# Altium schematic symbol library Altium_Lib.SchLib: 403 symbols (part 2 of 4) (continued)
## LED_BLUE__LTST-C171TBKT (continued)
LED BLUE CLEAR 0805 SMD; Manufacturer: Lite-On Inc.; Lens Color: Colorless; Millicandela Rating: 104mcd; Lens Style/Size: Rectangle with Flat Top, 1.40mm x 1.25mm; Voltage - Forward (Vf) (Typ): 3.3V; Current - Test: 20mA; Viewing Angle: 130°; Wavelength - Dominant: 470nm; Wavelength - Peak: 468nm; Manufacturer Part Number: LTST-C171TBKT; Category: Optoelectronics; Supplier: Digi-Key; RoHS: RoHS Compliant; Packaging: Tape & Reel (TR); Part Status: Active; Color: Blue; Lens Transparency: Clear; Mounting Type: Surface Mount; Features: -; Package / Case: 0805 (2012 Metric); Size / Dimension: 2.00mm L x 1.25mm W; Height (Max): 0.80mm; ComponentLink1URL: http://optoelectronics.liteon.com/upload/download/DS22-2000-233/LTST-C171TBKT(0630).pdf; ComponentLink1Description: http://optoelectronics.liteon.com/upload/download/DS22-2000-233/LTST-C171TBKT(0630).pdf; Pricing: 3000=0.0728, 6000=0.06552, 15000=0.05824, 30000=0.0546, 75000=0.04914, 150000=0.04732 (USD); Supplier Part Number: 160-1645-2-ND
footprint Diode_0805_Blue
pins: 1 A, 2 K

## LED_GREEN__LG L29K-F2J1-24-Z
designator D?, comment LG L29K-F2J1-24-Z  Color: Green
LED GREEN DIFFUSED 0603 SMD; Manufacturer: OSRAM Opto Semiconductors Inc.; Lens Style/Size: Rectangle with Flat Top, 1.30mm x 0.80mm; Lens Color: White; Wavelength - Peak: 572nm; Viewing Angle: 160°; Voltage - Forward (Vf) (Typ): 1.7V; Wavelength - Dominant: 570nm; Current - Test: 2mA; Millicandela Rating: 3.5mcd; Category: Optoelectronics; RoHS: RoHS Compliant; Supplier: Digi-Key; Packaging: Cut Tape (CT); Features: -; Manufacturer Part Number: LG L29K-F2J1-24-Z; Part Status: Active; Mounting Type: Surface Mount; Package / Case: 0603 (1608 Metric); Lens Transparency: Diffused; Supplier Device Package: 0603; Size / Dimension: 1.70mm L x 0.80mm W; Height (Max): 0.65mm; ComponentLink1URL: https://dammedia.osram.info/media/resource/hires/osram-dam-2493945/LG%20L29K.pdf; ComponentLink1Description: https://dammedia.osram.info/media/resource/hires/osram-dam-2493945/LG%20L29K.pdf; Pricing: 1=0.45, 10=0.319, 25=0.2768, 100=0.213, 250=0.17304, 500=0.12778, 1000=0.10648, 2500=0.09583 (USD); Supplier Part Number: 475-3118-1-ND
footprint DIODE_0603_Green (Chip Resistor; Body 1.6 x 0.8 mm (LxW typ))
pins: 1 A, 2 K

## LED_GREEN__LG R971-KN-1
designator D?, comment LG R971-KN-1
LED GREEN DIFFUSED 0805 SMD; Manufacturer: OSRAM Opto Semiconductors Inc.; ID: 1963782; Lens Color: White; Millicandela Rating: 26.05mcd; Lens Style/Size: Rectangle with Flat Top, 1.30mm x 1.25mm; Voltage - Forward (Vf) (Typ): 2.2V; Current - Test: 20mA; Viewing Angle: 160°; Wavelength - Dominant: 570nm; Wavelength - Peak: 572nm; Package Quantity: 1; RoHS: RoHS Compliant; Manufacturer Part Number: LG R971-KN-1; Supplier: Digi-Key; Category: Optoelectronics; Packaging: Tape & Reel (TR); Part Status: Active; Color: Green; Lens Transparency: Diffused; Mounting Type: Surface Mount; Features: -; Package / Case: 0805 (2012 Metric); Supplier Device Package: 0805; Size / Dimension: 2.00mm L x 1.25mm W; Height (Max): 0.90mm; ComponentLink1URL: http://www.osram-os.com/Graphics/XPic9/00078860_0.pdf; ComponentLink1Description: http://www.osram-os.com/Graphics/XPic9/00078860_0.pdf; Pricing: 4000=0.03966, 8000=0.03449, 12000=0.03104, 28000=0.02874 (USD); Supplier Part Number: 475-1410-2-ND
footprint Diode_0805_Green
pins: 1 A, 2 K

## LED_GREEN__LN38GPX
designator D?, comment LN38GPX  Color: Green
LED GREEN 3MM ROUND T/H; Manufacturer: Panasonic Electronic Components; Configuration: Standard; Millicandela Rating: 6mcd; Lens Style: Round with Domed Top; Lens Size: 3mm, T-1; Voltage - Forward (Vf) (Typ): 2.2V; Current - Test: 20mA; Wavelength - Peak: 565nm; Supplier 1: Digi-Key; Manufacturer Part Number: LN38GPX; RoHS: RoHS Compliant; Category: Optoelectronics; Stock 1: 0; Pricing 1: 1400=0 (USD); Packaging: Bulk; Part Status: Obsolete; Lens Color: -; Lens Transparency: -; Viewing Angle: -; Mounting Type: Through Hole; Wavelength - Dominant: -; Features: -; Package / Case: Radial; Supplier Device Package: Round Type; Size / Dimension: -; Height (Max): 5.70mm; Base Part Number: LN*8; ComponentLink1URL: https://media.digikey.com/pdf/Data%20Sheets/Panasonic%20LEDs%20PDFs/LN38GPX_Rev_Mar_2012.pdf; ComponentLink1Description: https://media.digikey.com/pdf/Data%20Sheets/Panasonic%20LEDs%20PDFs/LN38GPX_Rev_Mar_2012.pdf; Supplier Part Number 1: P564-ND
footprint Led-3mm-Green-h7
pins: 1 A, 2 K

## LED_GREEN__SML-M13MTT86
designator D?, comment SML-M13MTT86
LED Uni-Color Yellowish Green 2-Pin Chip 0805(2012Metric) T/R; Manufacturer: Rohm; Color: Green,Yellow; Lens Color: Colorless; Lens Style: Colorless,Rectangular; Dominant Wavelength: 572nm; Number of LEDs: 1; Forward Current: 20mA; Forward Voltage: 2.2V; Luminous Intensity: 45mcd; Lens Transparency: Clear; Supplier 1: Digi-Key; Manufacturer Part Number: SML-M13MTT86; RoHS: Yes; Category: LEDs; Mount: Surface Mount; Case/Package: 0805; Number of Pins: 2; Case Code (Metric): 2012; Case Code (Imperial): 0805; Min Operating Temperature: -40°C; Max Operating Temperature: 85°C; Package Quantity: 1; Illumination Color: Green; Packaging: Tape and Reel; Test Current: 20mA; Series: SML-M1; Length: 2mm; Width: 1.25mm; Height: 0.9mm; Radiation Hardening: No; Lead Free: Lead Free; RoHS Compliant: Yes; Supplier Part Number 1: 846-1028-1-ND; ComponentLink1Description: Datasheet; ComponentLink1URL: https://www.mouser.com.tr/datasheet/2/348/sml-m13x_mn2x-e-1874485.pdf
footprint Diode_0805_Green
pins: 1 A, 2 K

## LED_RED__LN28RPX
designator D?, comment LN28RPX  Lens Color: Red
LED RED DIFF 3MM ROUND T/H; Manufacturer: Panasonic Electronic Components; Lens Transparency: Diffused; Millicandela Rating: 2.8mcd; Lens Style/Size: Round with Domed Top, 3mm (T-1), 3.00mm; Voltage - Forward (Vf) (Typ): 2.2V; Current - Test: 15mA; Wavelength - Peak: 700nm; Manufacturer Part Number: LN28RPX; Category: Optoelectronics; Supplier: Digi-Key; RoHS: RoHS Compliant; Packaging: Bulk; Part Status: Not For New Designs; Color: Red; Viewing Angle: -; Mounting Type: Through Hole; Wavelength - Dominant: -; Features: -; Package / Case: Radial; Supplier Device Package: 3mm Round; Size / Dimension: -; Height (Max): 5.70mm; ComponentLink1URL: http://industrial.panasonic.com/www-cgi/jvcr13pz.cgi?E+SC+4+ATA7001+LN28RPX+8+WW; ComponentLink1Description: http://industrial.panasonic.com/www-cgi/jvcr13pz.cgi?E+SC+4+ATA7001+LN28RPX+8+WW; Pricing: 1=0.45, 10=0.326, 25=0.2664, 100=0.213, 250=0.17972, 500=0.15308, 1000=0.11981, 2500=0.10982, 5000=0.09984 (USD); Supplier Part Number: P563-ND
footprint Led-3mm-Red-h7
pins: 1 A, 2 K

## LED_RED__LS Q976-NR-1
designator D?, comment LS Q976-NR-1  Color: Red
LED RED DIFFUSED 0603 SMD; Manufacturer: OSRAM Opto Semiconductors Inc.; Lens Color: White; Lens Style/Size: Rectangle with Flat Top, 1.00mm x 0.80mm; Millicandela Rating: 104mcd; Current - Test: 20mA; Viewing Angle: 160°; Wavelength - Dominant: 633nm; Wavelength - Peak: 645nm; Voltage - Forward (Vf) (Typ): 2V; Size / Dimension: 1.60mm L x 0.80mm W; Height (Max): 0.80mm; Supplier: Digi-Key; Manufacturer Part Number: LS Q976-NR-1; Category: Optoelectronics; RoHS: RoHS Compliant; Part Status: Active; Packaging: Tape & Reel (TR); Lens Transparency: Diffused; Features: -; Package / Case: 0603 (1608 Metric); Supplier Device Package: 0603; Mounting Type: Surface Mount; ComponentLink1URL: https://dammedia.osram.info/media/resource/hires/osram-dam-2493499/LS%20Q976.pdf; ComponentLink1Description: https://dammedia.osram.info/media/resource/hires/osram-dam-2493499/LS%20Q976.pdf; Pricing: 4000=0.05566, 8000=0.0484, 12000=0.04356, 28000=0.03872, 100000=0.03267 (USD); Supplier Part Number: 475-2512-2-ND
footprint DIODE_0603_Red (Chip Resistor; Body 1.6 x 0.8 mm (LxW typ))
pins: 1 A, 2 K

## LED_RED__LS R976-NR-1
designator D?, comment LS R976-NR-1
LED RED DIFFUSED 0805 SMD; Manufacturer: OSRAM Opto Semiconductors Inc.; Wavelength - Dominant: 633nm; Viewing Angle: 160°; Wavelength - Peak: 645nm; Lens Color: White; Current - Test: 20mA; Lens Style/Size: Rectangle with Flat Top, 1.30mm x 1.25mm; Voltage - Forward (Vf) (Typ): 2V; Millicandela Rating: 104mcd; Package / Case: 0805 (2012 Metric); Packaging: Tape & Reel (TR); Features: -; Category: Optoelectronics; Supplier: Digi-Key; RoHS: RoHS Compliant; Manufacturer Part Number: LS R976-NR-1; Part Status: Active; Mounting Type: Surface Mount; Supplier Device Package: 0805; Lens Transparency: Diffused; Color: Red; Size / Dimension: 2.00mm L x 1.25mm W; Height (Max): 0.90mm; ComponentLink1URL: http://www.osram-os.com/Graphics/XPic8/00078896_0.pdf; ComponentLink1Description: http://www.osram-os.com/Graphics/XPic8/00078896_0.pdf; Pricing: 4000=0.04175, 8000=0.0363, 12000=0.03267, 28000=0.03025 (USD); Supplier Part Number: 475-1278-2-ND
footprint Diode_0805_Red
pins: 1 A, 2 K

## LED_WHITE__2T05x5NW20000001
designator D?
ET-5630X-AF1W series White LED; Manufacturer: EDISON OPTO CORPORATION; Manufacturer Part Number: 2T05x5NW20000001
footprint PLCC 5630
pins: 0 Termal, 1 A, 2 K

## LED_WHITE__CLA2A-WKW-CXBZ0153
designator D?, comment Illumination Color: Cool White  (hidden comment: CLA2A-WKW-CXbZ0153)
LED COOL WHITE DIFF 4PLCC SMD; Manufacturer: Cree, Inc.; Power Rating: 2 x 100 mW; Lens Color: Tinted; Lens Shape: Round Flat; Luminous Intensity: 3800 mcd; Viewing Angle: 120 deg; If - Forward Current: 20 mA; Vf - Forward Voltage: 3.2 V; Vr - Reverse Voltage: 5 V; Wavelength/Color Temperature: 5500 K; Supplier 1: Mouser; Manufacturer Part Number: CLA2A-WKW-CXbZ0153; RoHS: RoHS Compliant; Category: Standard LEDs - SMD; Stock 1: 3506; Pricing 1: 1=0.290, 10=0.270, 100=0.247, 1000=0.223, 2000=0.223, 10000=0.217, 50000=0.200 (USD); Height: 1.9 mm; Length: 3.2 mm; Package / Case: PLCC-4; Packaging: Cut Tape; Product: White LEDs; Width: 2.8 mm; Brand: Cree, Inc.; Mounting Style: SMD/SMT; Peak Wavelength: -; Color Rendering Index - CRI: -; Lens Dimensions: -; Luminous Flux/Radiant Flux: -; Maximum Operating Temperature: + 100 C; Minimum Operating Temperature: - 40 C; Moisture Sensitive: Yes; Operating Supply Voltage: -; Product Type: LED - Standard; Standard Pack Qty: 2000; Subcategory: LEDs; RoHS - Mouser: Y; Minimum Order Quantity: 1; Reeling: True; ComponentLink1URL: https://www.mouser.com/datasheet/2/90/CLA2AWKW(931)-1140814.pdf; ComponentLink1Description: https://www.mouser.com/datasheet/2/90/CLA2AWKW(931)-1140814.pdf; Supplier Part Number 1: 941-CLA2AWKWCXBZ0153
footprint LED_PLCC4_3.2x2.8_WHITE
pins: 1 A, 2 A, 3 K, 4 K

## LIS2DH12TR
designator U?
ACCEL 2-16G I2C/SPI 12LGA; Manufacturer: STMicroelectronics; Axis: X, Y, Z; Acceleration Range: ±2g, 4g, 8g, 16g; Output Type: I²C, SPI; Sensitivity (LSB/g): 1000 (±2g) ~ 83 (±16g); Bandwidth: 0.5Hz ~ 672Hz; Voltage - Supply: 1.71 V ~ 3.6 V; Operating Temperature: -40°C ~ 85°C (TA); Package / Case: 12-VFLGA; Part Status: Active; Type: Digital; Features: Adjustable Bandwidth, Selectable Scale, Sleep Mode, Temperature Sensor; Category: Sensors, Transducers; Packaging: Cut Tape (CT); Manufacturer Part Number: LIS2DH12TR; Sensitivity (mV/g): -; Supplier Device Package: 12-LGA (2x2); RoHS: RoHS Compliant; Mounting Type: Surface Mount; Supplier: Digi-Key; ComponentLink1URL: http://www.st.com/content/ccc/resource/technical/document/datasheet/12/c0/5c/36/b9/58/46/f2/DM00091513.pdf/files/DM00091513.pdf/jcr:content/translations/en.DM00091513.pdf; ComponentLink1Description: http://www.st.com/content/ccc/resource/technical/document/datasheet/12/c0/5c/36/b9/58/46/f2/DM00091513.pdf/files/DM00091513.pdf/jcr:content/translations/en.DM00091513.pdf; Pricing: 1=1.53, 10=1.367, 100=1.0661, 500=0.88066, 1000=0.69525 (USD); Supplier Part Number: 497-14851-1-ND
footprint LGA-12
pins: 1 SCL/SPC, 2 CS, 3 SDO/SA0, 4 SDA/SDI/SDO, 5 RES, 6 GND, 7 GND, 8 GND, 9 VDD, 10 VDD_IO, 11 INT2, 12 INT1

## LIS3DH
designator U?
MEMS Motion Sensor LGA; Manufacturer: STMicroelectronics; Interface: I2C,SPI; Axis: X, Y, Z; Bandwidth: 5kHz; Output Type: Digital; Operating Supply Voltage: 2.5V; Sensor Type: 3 Axis; Min Supply Voltage: 1.71V; Max Supply Voltage: 3.6V; Resolution: 16b; Operating Supply Current: 11uA; Supplier 1: Avnet; Manufacturer Part Number: LIS3DH; Stock 1: 0; Case/Package: LGA; Number of Pins: 16; Min Operating Temperature: -40°C; Max Operating Temperature: 85°C; Package Quantity: 490; Packaging: Tray; Series: LIS3DH; Max Supply Voltage (DC): 3.6V; Min Supply Voltage (DC): 1.71V; Length: 3mm; Width: 3mm; Height: 1mm; Depth: 3mm; Radiation Hardening: No; REACH SVHC: No SVHC; Lead Free: Lead Free; RoHS Compliant: Yes; ComponentLink1URL: http://www.farnell.com/datasheets/1834384.pdf?src-supplier=Element14; ComponentLink1Description: http://www.farnell.com/datasheets/1834384.pdf?src-supplier=Element14; ComponentLink2URL: http://www.st.com/content/ccc/resource/technical/document/datasheet/3c/ae/50/85/d6/b1/46/fe/CD00274221.pdf/files/CD00274221.pdf/jcr:content/translations/en.CD00274221.pdf?src-supplier=Digi-Key; ComponentLink2Description: http://www.st.com/content/ccc/resource/technical/document/datasheet/3c/ae/50/85/d6/b1/46/fe/CD00274221.pdf/files/CD00274221.pdf/jcr:content/translations/en.CD00274221.pdf?src-supplier=Digi-Key; ComponentLink3URL: http://www.mouser.com/ds/2/389/lis3dh-955037.pdf?src-supplier=Mouser; ComponentLink3Description: http://www.mouser.com/ds/2/389/lis3dh-955037.pdf?src-supplier=Mouser; ComponentLink4URL: http://www.st.com/web/en/resource/technical/document/datasheet/CD00274221.pdf?src-supplier=Avnet+Europe; ComponentLink4Description: http://www.st.com/web/en/resource/technical/document/datasheet/CD00274221.pdf?src-supplier=Avnet+Europe; ComponentLink5URL: http://datasheet.iiic.cc/stmicroelectronics/LIS3DH.pdf?src-supplier=IIIC; ComponentLink5Description: http://datasheet.iiic.cc/stmicroelectronics/LIS3DH.pdf?src-supplier=IIIC; Supplier Part Number 1: LIS3DH
footprint VFLGA-16
pins: 1 VDD_IO, 2 NC, 3 NC, 4 SCL/SPC, 5 GND, 6 SDA/SDI/SDO, 7 SA0/SDO, 8 CS, 9 INT2, 10 RES, 11 INT1, 12 GND, 13 ADC3, 14 VDD, 15 ADC2, 16 ADC1

## LM35DZ/NOPB
designator T?
SENSOR TEMP ANLG VOLT TO-92-3; Manufacturer: Texas Instruments; Voltage - Supply: 4 V ~ 30 V; Resolution: 10mV/°C; Output Type: Analog Voltage; Test Condition: 25°C; Accuracy - Highest (Lowest): ±1.5°C; Sensing Temperature - Local: 0°C ~ 100°C; Sensor Type: Analog, Local; Category: Sensors, Transducers; Packaging: Bulk; Part Status: Active; Operating Temperature: 0°C ~ 100°C; Supplier: Digi-Key; Manufacturer Part Number: LM35DZ/NOPB; Mounting Type: Through Hole; Features: -; Package / Case: TO-226-3, TO-92-3 (TO-226AA); Sensing Temperature - Remote: -; Supplier Device Package: TO-92-3; RoHS: RoHS Compliant; ComponentLink1URL: http://www.ti.com/lit/ds/symlink/lm35.pdf; ComponentLink1Description: http://www.ti.com/lit/ds/symlink/lm35.pdf; Pricing: 1=1.86, 10=1.459, 25=1.2572, 100=0.9878, 250=0.898, 500=0.83066, 1000=0.74085 (USD); Stock: 11050; Supplier Part Number: LM35DZ/NOPB-ND
footprint TO-92
pins: 1 +VS (power), 2 Vout (power), 3 GND (power)

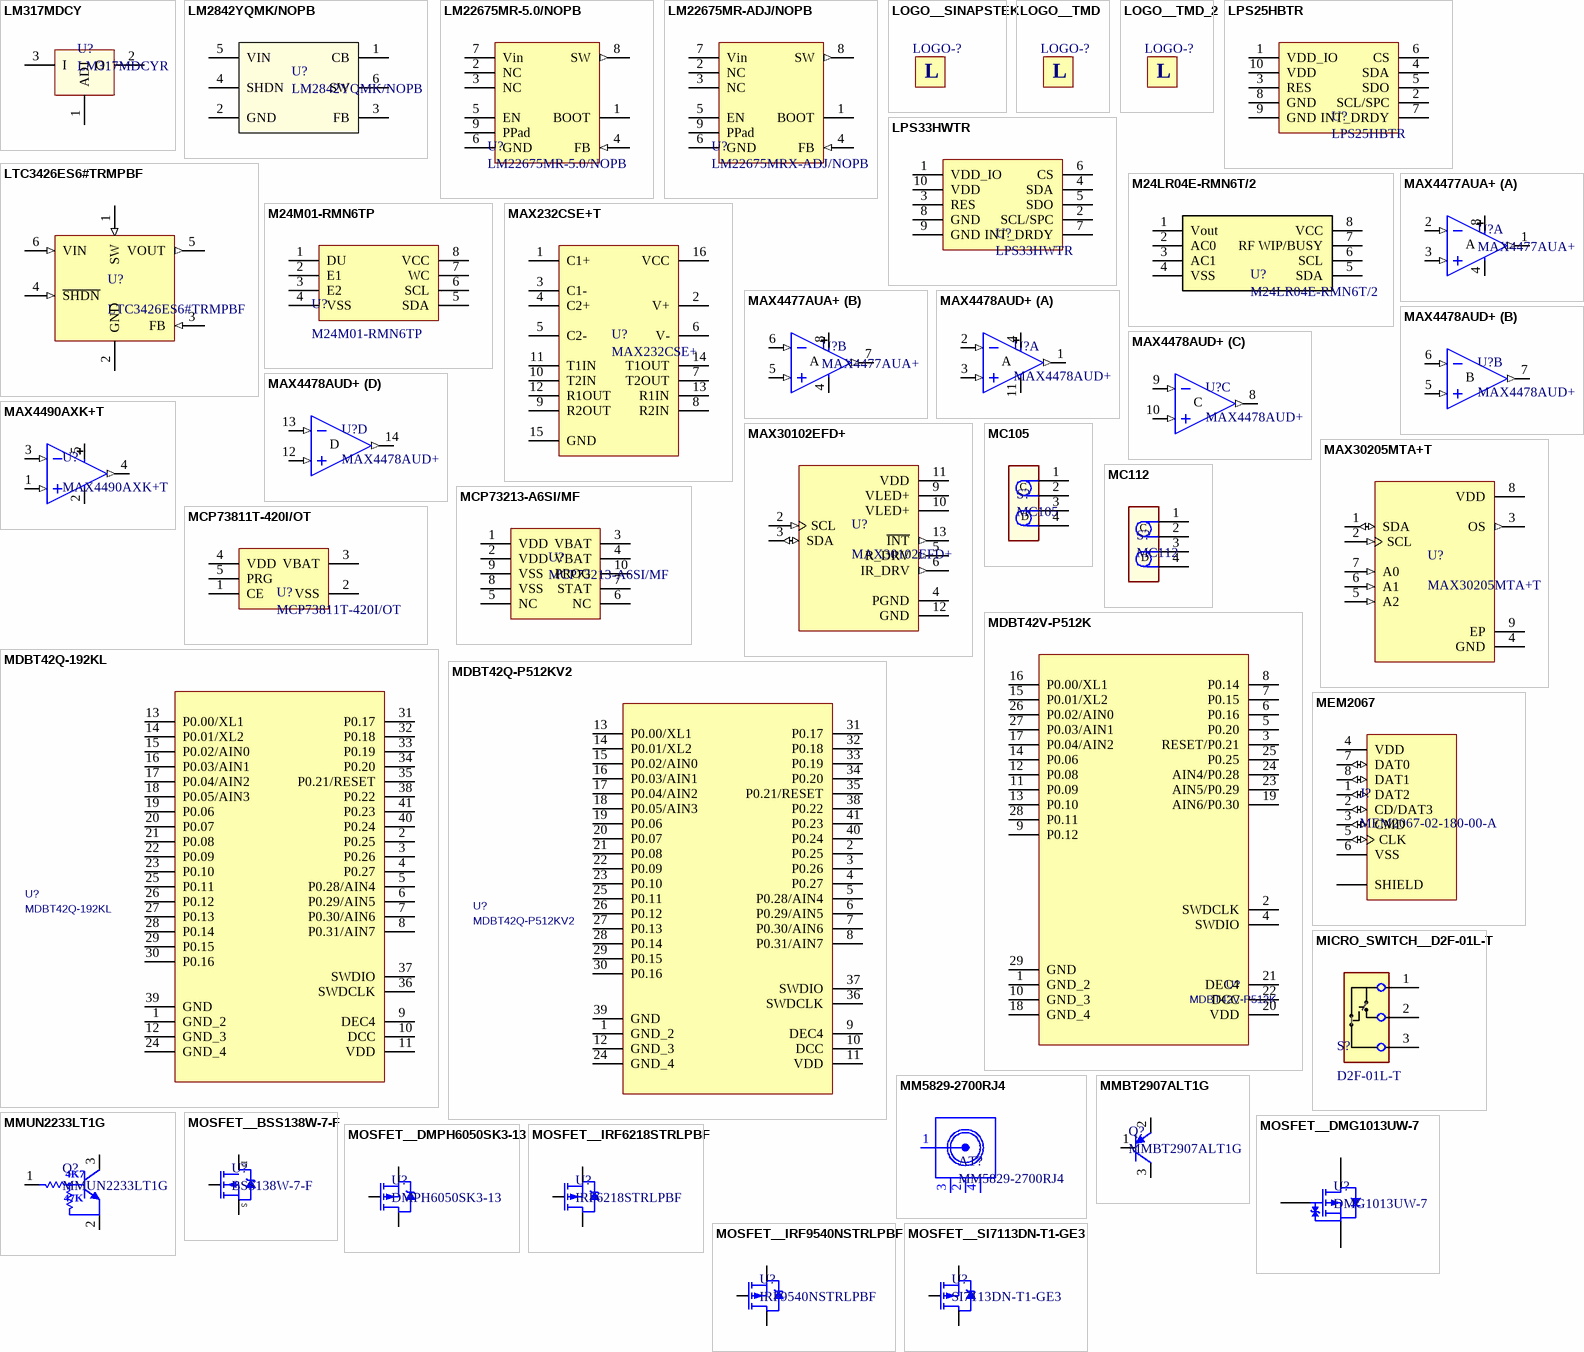
[diagram p6: symbols LM317MDCY to MOSFET__SI7113DN-T1-GE3]

## LM317MDCY
designator U?, comment LM317MDCYR
IC REG LINEAR ADJ 0.5A SOT223; Manufacturer: Texas Instruments; Regulator Topology: Positive Adjustable; Current - Output: 500mA; Voltage - Output: 1.25 V ~ 37 V; Voltage - Input: 4.2 V ~ 40 V; Packaging: Tape & Reel (TR); Manufacturer Part Number: LM317MDCYR; Supplier: Digi-Key; Part Status: Active; RoHS: RoHS Compliant; Supplier Device Package: SOT-223-4; Package / Case: TO-261-4, TO-261AA; Voltage - Dropout (Typical): -; Mounting Type: Surface Mount; Current - Limit (Min): -; Operating Temperature: 0°C ~ 125°C; Category: Integrated Circuits (ICs); ComponentLink1URL: http://www.ti.com/lit/ds/symlink/lm317m.pdf; ComponentLink1Description: http://www.ti.com/lit/ds/symlink/lm317m.pdf; Pricing: 2500=0.319, 5000=0.297, 12500=0.286 (USD); Supplier Part Number: 296-12631-2-ND
footprint SOT-223-4 (SOT223/SC73, 4-Leads, Body 6.5x3.5mm, Pitch 2.3mm, Lead Span 7mm, IPC High Density)
pins: 1 ADJ (power), 2 O (power), 3 I (power)

## LM2842YQMK/NOPB
designator U?
IC REG BUCK ADJ 0.6A TSOT23-6; Manufacturer: Texas Instruments; Voltage - Output (Max): 34V; Voltage - Output (Min/Fixed): 0.765V; Voltage - Input (Max): 42V; Voltage - Input (Min): 4.5V; Synchronous Rectifier: No; Number of Outputs: 1; Frequency - Switching: 1.25MHz; Current - Output: 600mA; Output Type: Adjustable; Output Configuration: Positive; Function: Step-Down; Base Part Number: LM2842; Package / Case: SOT-23-6 Thin, TSOT-23-6; Supplier Device Package: TSOT-23-6; Mounting Type: Surface Mount; Operating Temperature: -40°C ~ 125°C (TJ); Packaging: Tape & Reel (TR); Topology: Buck; Part Status: Active; RoHS: RoHS Compliant; Supplier: Digi-Key; Category: Integrated Circuits (ICs); Manufacturer Part Number: LM2842YQMK/NOPB; ComponentLink1URL: http://www.ti.com/lit/ds/symlink/lm2841.pdf; ComponentLink1Description: http://www.ti.com/lit/ds/symlink/lm2841.pdf; Pricing: 1000=1.7864, 2000=1.69708, 5000=1.63328 (USD); Supplier Part Number: 296-35999-2-ND
footprint SOT23-6 (SOT-23/SC-74A; 5 Leads; Body 3 x 3 mm, inc. leads (LxW max))
pins: 1 CB, 2 GND, 3 FB, 4 SHDN, 5 VIN, 6 SW

## LM22675MR-5.0/NOPB
designator U?
IC REG BUCK 5V 1A 8SOPWRPAD; Manufacturer: Texas Instruments; Frequency - Switching: 500kHz; Function: Step-Down; Number of Outputs: 1; Output Configuration: Positive; Output Type: Fixed; Synchronous Rectifier: No; Voltage - Input (Max): 42V; Voltage - Input (Min): 4.5V; Category: Integrated Circuits (ICs); Current - Output: 1A; Manufacturer Part Number: LM22675MR-5.0/NOPB; Mounting Type: Surface Mount; Operating Temperature: -40°C ~ 125°C (TJ); Package / Case: 8-PowerSOIC (0.154", 3.90mm Width); Packaging: Tube; Part Status: Active; RoHS: RoHS Compliant; Supplier: Digi-Key; Supplier Device Package: 8-SO PowerPad; Topology: Buck; Voltage - Output (Max): -; Voltage - Output (Min/Fixed): 5V; ComponentLink1URL: http://www.ti.com/lit/ds/symlink/lm22675.pdf; ComponentLink1Description: http://www.ti.com/lit/ds/symlink/lm22675.pdf; Pricing: 1=4.44, 10=3.984, 100=3.2643, 500=2.77884, 1000=2.3436 (USD); Supplier Part Number: LM22675MR-5.0/NOPB-ND
footprint SOIC_8_Power (8-PowerSOIC (0.154", 3.90mm Width))
pins: 1 BOOT (power), 2 NC, 3 NC, 4 FB (in), 5 EN (power), 6 GND (power), 7 Vin (power), 8 SW (out), 9 PPad (power)

## LM22675MR-ADJ/NOPB
designator U?, comment LM22675MRX-ADJ/NOPB
IC REG BUCK ADJ 1A 8SOPWRPAD; Manufacturer: Texas Instruments; Voltage - Output (Max): 37V; Synchronous Rectifier: No; Frequency - Switching: 500kHz; Output Configuration: Positive; Voltage - Input (Max): 42V; Voltage - Input (Min): 4.5V; Number of Outputs: 1; Voltage - Output (Min/Fixed): 1.285V; Function: Step-Down; Output Type: Adjustable; Supplier Device Package: 8-SO PowerPad; Manufacturer Part Number: LM22675MRX-ADJ/NOPB; Package / Case: 8-PowerSOIC (0.154", 3.90mm Width); RoHS: RoHS Compliant; Mounting Type: Surface Mount; Current - Output: 1A; Part Status: Active; Operating Temperature: -40°C ~ 125°C (TJ); Base Part Number: LM22675; Supplier: Digi-Key; Packaging: Cut Tape (CT); Topology: Buck; Category: Integrated Circuits (ICs); ComponentLink1URL: http://www.ti.com/lit/ds/symlink/lm22675.pdf; ComponentLink1Description: http://www.ti.com/lit/ds/symlink/lm22675.pdf; Supplier 1: Digi-Key; Supplier Part Number: 296-37362-1-ND
footprint SOIC_8_Power (8-PowerSOIC (0.154", 3.90mm Width))
pins: 1 BOOT (power), 2 NC, 3 NC, 4 FB (in), 5 EN (power), 6 GND (power), 7 Vin (power), 8 SW (out), 9 PPad (power)

## LOGO__SINAPSTEK
designator LOGO-?, comment Logo  (value not drawn)  (no BOM)
Value: Logo
footprint Logo-Sinapstek
text: L

## LOGO__TMD
designator LOGO-?, comment Logo  (value not drawn)  (no BOM)
Value: Logo
footprint Logo-TMD
text: L

## LOGO__TMD_2
designator LOGO-?, comment Logo  (value not drawn)  (no BOM)
Value: Logo
footprint Logo-TMD2
text: L

## LPS25HBTR
designator U?
IC MEMS PRESSURE SENSOR 10HCLGA; Manufacturer: STMicroelectronics; Pressure Type: Absolute; Operating Pressure: 3.77 PSI ~ 18.27 PSI (26 kPa ~ 126 kPa); Output Type: I²C, SPI; Output: 24 b; Accuracy: ±0.003 PSI (±0.02 kPa); Voltage - Supply: 1.7 V ~ 3.6 V; Port Style: No Port; Maximum Pressure: 290.08 PSI (2000 kPa); Manufacturer Part Number: LPS25HBTR; Category: Sensors, Transducers; Supplier: Digi-Key; RoHS: RoHS Compliant; Part Status: Active; Port Size: -; Features: Temperature Compensated; Termination Style: Solder Pad; Operating Temperature: -30°C ~ 105°C; Package / Case: 10-VFLGA; Supplier Device Package: 10-LLGA (2.5x2.5); ComponentLink1URL: http://www.st.com/content/ccc/resource/technical/document/datasheet/9a/4c/aa/72/1f/45/4e/24/DM00141379.pdf/files/DM00141379.pdf/jcr:content/translations/en.DM00141379.pdf; ComponentLink1Description: http://www.st.com/content/ccc/resource/technical/document/datasheet/9a/4c/aa/72/1f/45/4e/24/DM00141379.pdf/files/DM00141379.pdf/jcr:content/translations/en.DM00141379.pdf; Supplier Part Number: 497-15070-2-ND
footprint HLGA-10L
pins: 1 VDD_IO, 2 SCL/SPC, 3 RES, 4 SDA, 5 SDO, 6 CS, 7 INT_DRDY, 8 GND, 9 GND, 10 VDD

## LPS33HWTR
designator U?
CONSUMER MEMS; Manufacturer: STMicroelectronics; Pressure Type: Absolute; Operating Pressure: 0.04 PSI ~ 0.18 PSI (0.26 kPa ~ 1.26 kPa); Output Type: I²C, SPI; Output: 24 b; Accuracy: ±0.015 PSI (±0.1 kPa); Voltage - Supply: 1.7 V ~ 3.6 V; Port Style: No Port; Maximum Pressure: 290.08 PSI (2000 kPa); Manufacturer Part Number: LPS33HWTR; Category: Sensors, Transducers; Supplier: Digi-Key; RoHS: Request Inventory Verification; Part Status: Active; Port Size: -; Features: Temperature Compensated; Termination Style: Surface Mount; Operating Temperature: -40°C ~ 85°C; Package / Case: LGA; Supplier Device Package: 10-CCLGA (3.3x3.3); ComponentLink1URL: http://www.st.com/content/ccc/resource/technical/document/datasheet/group3/9f/16/0d/6e/ea/20/4e/dc/DM00386016/files/DM00386016.pdf/jcr:content/translations/en.DM00386016.pdf; ComponentLink1Description: http://www.st.com/content/ccc/resource/technical/document/datasheet/group3/9f/16/0d/6e/ea/20/4e/dc/DM00386016/files/DM00386016.pdf/jcr:content/translations/en.DM00386016.pdf; Pricing: 2500=4.6813 (USD); Supplier Part Number: 497-17590-2-ND
footprint CCLGA-10L (CCLGA - 10L (3.3 x 3.3 x max 2.9 mm))
pins: 0 TPAD hidden to GND, 1 VDD_IO, 2 SCL/SPC, 3 RES, 4 SDA, 5 SDO, 6 CS, 7 INT_DRDY, 8 GND, 9 GND, 10 VDD

## LTC3426ES6#TRMPBF
designator U?
Conv DC-DC 1.6V to 4.3V Step Up Single-Out 2.25V to 5V 2.3A Automotive 6-Pin TSOT-23 T/R; Manufacturer: Analog Devices / Linear Technology; Output Voltage: 5.5V; Output Current: 2A; Switching Frequency: 1.5MHz; Number of Outputs: 1; Synchronous Rectifier: No; Topology: Boost; Output Type: Adjustable; Supplier 1: Digi-Key; Manufacturer Part Number: LTC3426ES6#TRMPBF; RoHS: Yes; Category: Voltage Regulators - Switching; Case/Package: SOT-23-6; Number of Pins: 6; Min Operating Temperature: -40°C; Max Operating Temperature: 85°C; Max Input Voltage: 4.3V; Package Quantity: 1; Min Input Voltage: 1.6V; Packaging: Tape and Reel; Min Output Voltage: 2.25V; Max Output Voltage: 5V; Series: -; REACH SVHC: No SVHC; Lead Free: Lead Free; RoHS Compliant: Yes; ComponentLink1URL: https://datasheet.ciiva.com/2024/6025-2024433.pdf?src-supplier=Digi-Key; ComponentLink1Description: Datasheet; Supplier Part Number 1: LTC3426ES6#TRMPBFCT-ND
footprint sot-6
pins: 1 SW (in), 2 GND (power), 3 FB (in), 4 ~{SHDN} (in), 5 VOUT (out), 6 VIN (in)

## M24LR04E-RMN6T/2
designator U?
NFC/RFID 4KBIT EEPROM 13.56MHZ; Manufacturer: STMicroelectronics; Interface: I²C; Standards: ISO 15693, ISO 18000-3, NFC; Voltage - Supply: 1.8 V ~ 5.5 V; Type: RFID Transponder; Category: RF/IF and RFID; RoHS: RoHS Compliant; Part Status: Active; Packaging: Tape & Reel (TR); Frequency: 13.56MHz; Manufacturer Part Number: M24LR04E-RMN6T/2; Operating Temperature: -40°C ~ 85°C; Supplier Device Package: 8-SO; Package / Case: 8-SOIC (0.154", 3.90mm Width); Supplier: Digi-Key; ComponentLink1URL: http://www.st.com/content/ccc/resource/technical/document/datasheet/4e/fd/ac/70/b2/bc/43/fa/DM00038059.pdf/files/DM00038059.pdf/jcr:content/translations/en.DM00038059.pdf; ComponentLink1Description: http://www.st.com/content/ccc/resource/technical/document/datasheet/4e/fd/ac/70/b2/bc/43/fa/DM00038059.pdf/files/DM00038059.pdf/jcr:content/translations/en.DM00038059.pdf; Pricing: 2500=0.5053, 5000=0.47372 (USD); Supplier Part Number: 497-12878-2-ND
footprint SOIC-8_L (SOIC, 8-Leads, Body 4.9x3.9mm, Pitch 1.27mm, IPC High Density)
pins: 1 Vout, 2 AC0, 3 AC1, 4 VSS, 5 SDA, 6 SCL, 7 RF WIP/BUSY, 8 VCC

## M24M01-RMN6TP
designator U?
EEPROM 1 Mbit Serial; Manufacturer: STMicroelectronics; Access Time: 900 ns; Memory Size: 1 Mbit; Organization: 128 k x 8; Interface Type: Serial, 2-Wire, I2C; Supply Current - Max: 2 mA; Data Retention: 40 Year; Maximum Clock Frequency: 0.4 MHz; Operating Supply Voltage: 2.5 V, 3.3 V, 5 V; Programming Voltage: 1.8 V to 5.5 V; Supply Voltage - Max: 5.5 V; Supply Voltage - Min: 1.8 V; Supplier 1: Mouser; Manufacturer Part Number: M24M01-RMN6TP; RoHS: RoHS Compliant; Category: EEPROM; Stock 1: 582; Pricing 1: 1=0.960, 10=0.853, 100=0.763, 500=0.740, 1000=0.718, 2500=0.633, 10000=0.612 (USD); Height: 1.65 mm; Length: 5 mm; Package / Case: SOIC-8; Packaging: Cut Tape; Series: M24M01-R; Width: 4 mm; Brand: STMicroelectronics; Mounting Style: SMD/SMT; Maximum Operating Temperature: + 85 C; Minimum Operating Temperature: - 40 C; Operating Supply Current: 2 mA; Product Type: EEPROM; Standard Pack Qty: 2500; Subcategory: Memory & Data Storage; RoHS - Mouser: Y; Minimum Order Quantity: 1; Reeling: True; ComponentLink1URL: https://www.mouser.com/datasheet/2/389/cd00147128-1796560.pdf; ComponentLink1Description: https://www.mouser.com/datasheet/2/389/cd00147128-1796560.pdf; Supplier Part Number 1: 511-M24M01-RMN6TP
footprint SOIC-8_L (SOIC, 8-Leads, Body 4.9x3.9mm, Pitch 1.27mm, IPC High Density)
pins: 1 DU, 2 E1, 3 E2, 4 VSS, 5 SDA, 6 SCL, 7 WC, 8 VCC

## MAX232CSE+T
designator U?, comment MAX232CSE+
IC RS-232 DVR/RCVR 16-SOIC; Manufacturer: Maxim Integrated; Data Rate: 120Kbps; Protocol: RS232; Duplex: Full; Voltage - Supply: 4.5 V ~ 5.5 V; Number of Drivers/Receivers: 2/2; Type: Transceiver; Packaging: Tube; Operating Temperature: 0°C ~ 70°C; Package / Case: 16-SOIC (0.154", 3.90mm Width); Supplier: Digi-Key; Manufacturer Part Number: MAX232CSE+; Part Status: Active; RoHS: RoHS Compliant; Mounting Type: Surface Mount; Category: Integrated Circuits (ICs); Supplier Device Package: 16-SOIC; ComponentLink1URL: https://datasheets.maximintegrated.com/en/ds/MAX220-MAX249.pdf; ComponentLink1Description: https://datasheets.maximintegrated.com/en/ds/MAX220-MAX249.pdf; Pricing: 1=2.47, 10=2.347, 25=2.19, 50=2.1504 (USD); Supplier Part Number: MAX232CSE+-ND
footprint SOIC-16_N (SOIC, 16-Leads, Body 9.9x3.9mm, Pitch 1.27mm, IPC Medium Density)
pins: 1 C1+, 2 V+, 3 C1-, 4 C2+, 5 C2-, 6 V-, 7 T2OUT, 8 R2IN, 9 R2OUT, 10 T2IN, 11 T1IN, 12 R1OUT, 13 R1IN, 14 T1OUT, 15 GND, 16 VCC

## MAX4477AUA+
designator U?
IC OPAMP GP 10MHZ RRO 8UMAX; Manufacturer: Maxim Integrated; Slew Rate: 3 V/µs; Amplifier Type: General Purpose; Output Type: Rail-to-Rail; Number of Circuits: 2; Voltage - Supply, Single/Dual (±): 2.7 V ~ 5.5 V, ±1.35 V ~ 2.75 V; Current - Output / Channel: 48mA; Current - Supply: 2.5mA; RoHS: RoHS Compliant; Packaging: Tube; Supplier Device Package: 8-uMAX; Package / Case: 8-TSSOP, 8-MSOP (0.118", 3.00mm Width); Operating Temperature: -40°C ~ 125°C; Mounting Type: Surface Mount; Part Status: Active; -3db Bandwidth: -; Supplier: Digi-Key; Category: Integrated Circuits (ICs); Manufacturer Part Number: MAX4477AUA+; ComponentLink1URL: https://datasheets.maximintegrated.com/en/ds/MAX4475-MAX4489.pdf; ComponentLink1Description: https://datasheets.maximintegrated.com/en/ds/MAX4475-MAX4489.pdf; Pricing: 1=1.67, 10=1.607 (USD); Supplier Part Number: MAX4477AUA+-ND
footprint SO/uMAX
part A pins: 1 OUT_B (out), 2 IN-_B (in), 3 IN+_B (in), 4 GND (power), 8 Vcc (power)
part B pins: 4 GND (power), 5 IN+_B (in), 6 IN-_B (in), 7 OUT_B (out), 8 Vcc (power)
part A text: A
part B text: A

## MAX4478AUD+
designator U?
IC OPAMP GP 4 CIRCUIT 14TSSOP; Manufacturer: Maxim Integrated; Amplifier Type: Low Noise Amplifier; Supply Type: Single; Number of Channels: 4 Channel; Shutdown: No Shutdown; CMRR - Common Mode Rejection Ratio: 90 dB; en - Input Voltage Noise Density: 21 nV/sqrt Hz; GBP - Gain Bandwidth Product: 10 MHz; Ib - Input Bias Current: 150 pA; In - Input Noise Current Density: 0.0005 pA/sqrt Hz; Operating Supply Current: 2.2 mA; Operating Supply Voltage: 2.7 V to 5.5 V; Output Current per Channel: 48 mA; Pd - Power Dissipation: 727 mW; SR - Slew Rate: 3 V/us; Supply Voltage - Max: 5.5 V; Supply Voltage - Min: 2.7 V; Voltage Gain dB: 120 dB; Vos - Input Offset Voltage: 350 uV; Supplier 1: Mouser; Manufacturer Part Number: MAX4478AUD+; RoHS: RoHS Compliant; Category: Operational Amplifiers - Op Amps; Stock 1: 735; Pricing 1: 1=3.11, 10=2.80, 25=2.64, 100=2.24 (USD); Height: 0.9 mm; Length: 5 mm; Package / Case: TSSOP-14; Packaging: Tube; Product: Operational Amplifiers; Series: MAX4478; Technology: BiCMOS; Width: 4.4 mm; Brand: Maxim Integrated; Mounting Style: SMD/SMT; Maximum Operating Temperature: + 125 C; Minimum Operating Temperature: - 40 C; Product Type: Op Amps - Operational Amplifiers; PSRR - Power Supply Rejection Ratio: 90 dB; Standard Pack Qty: 192; Subcategory: Amplifier ICs; RoHS - Mouser: Y; Minimum Order Quantity: 1; Reeling: False; ComponentLink1URL: https://www.mouser.com/datasheet/2/256/MAX4475-MAX4489-1265188.pdf; ComponentLink1Description: https://www.mouser.com/datasheet/2/256/MAX4475-MAX4489-1265188.pdf; Supplier Part Number 1: 700-MAX4478AUD
footprint TSSOP-14_M (TSOP, 14-Leads, Body 5x4.4mm, Pitch 0.65mm, IPC Low Density)
part A pins: 1 OUT_B (out), 2 IN-_B (in), 3 IN+_B (in), 4 Vcc (power), 11 GND (power)
part B pins: 4 Vcc (power) hidden, 5 IN+_B (in), 6 IN-_B (in), 7 OUT_B (out), 11 GND (power) hidden
part C pins: 8 OUT_C (out), 9 IN-_C (in), 10 IN+_C (in)
part D pins: 12 IN+_D (in), 13 IN-_D (in), 14 OUT_D (out)
part A text: A
part B text: B
part C text: C
part D text: D

## MAX4490AXK+T
designator U?
IC OPAMP GP 1 CIRCUIT SC70-5; Manufacturer: Maxim Integrated; Amplifier Type: General Purpose Amplifier; Supply Type: Single, Dual; Number of Channels: 1 Channel; Shutdown: No Shutdown; CMRR - Common Mode Rejection Ratio: 54 dB; en - Input Voltage Noise Density: 12 nV/sqrt Hz; GBP - Gain Bandwidth Product: 10 MHz; Ib - Input Bias Current: 2.5 nA; In - Input Noise Current Density: 0.001 pA/sqrt Hz; Maximum Dual Supply Voltage: +/- 2.75 V; Minimum Dual Supply Voltage: +/- 1.35 V; Operating Supply Current: 800 uA; Operating Supply Voltage: 2.7 V to 5.5 V, +/- 1.35 V to +/- 2.75 V; Output Current per Channel: 50 mA; Pd - Power Dissipation: 200 mW; PSRR - Power Supply Rejection Ratio: 65 dB; SR - Slew Rate: 10 V/us; Supply Voltage - Max: 5.5 V; Supply Voltage - Min: 2.7 V; Voltage Gain dB: 110 dB; Vos - Input Offset Voltage: 10 mV; Supplier 1: Mouser; Manufacturer Part Number: MAX4490AXK+T; RoHS: RoHS Compliant; Category: Operational Amplifiers - Op Amps; Stock 1: 3815; Pricing 1: 1=1.36, 10=1.22, 25=1.15, 50=1.03, 100=0.924, 250=0.830, 2500=0.830 (USD); Height: 0.9 mm; Length: 2 mm; Package / Case: SC-70-5; Packaging: Cut Tape; Product: Operational Amplifiers; Series: MAX4490; Technology: CMOS; Width: 1.25 mm; Brand: Maxim Integrated; Mounting Style: SMD/SMT; Maximum Operating Temperature: + 125 C; Minimum Operating Temperature: - 40 C; Product Type: Op Amps - Operational Amplifiers; Standard Pack Qty: 2500; Subcategory: Amplifier ICs; RoHS - Mouser: Y; Minimum Order Quantity: 1; Reeling: True; ComponentLink1URL: https://www.mouser.com/datasheet/2/256/MAX4490-MAX4492-1291555.pdf; ComponentLink1Description: https://www.mouser.com/datasheet/2/256/MAX4490-MAX4492-1291555.pdf; Supplier Part Number 1: 700-MAX4490AXKT
footprint SC-70-5
pins: 1 IN+ (in), 2 GND (power), 3 IN- (in), 4 OUT (out), 5 VDD (power)

## MAX30102EFD+
designator U?
High-Sensitivity Pulse Oximeter and Heart-Rate Sensor Digital Output 14-Pin OLGA Tray; Manufacturer: Maxim; MF: Maxim Integrated; Min Supply Voltage: 1.7V; Max Supply Voltage: 2V; Price: None; Value: *; Package: OLGA-14 Maxim; Availability: Unavailable; MP: MAX30102EFD+; Supplier 1: Digi-Key; Manufacturer Part Number: MAX30102EFD+; RoHS: Yes; Category: Decoders and Multiplexers; Number of Pins: 14; Min Operating Temperature: -40°C; Max Operating Temperature: 85°C; REACH SVHC: No SVHC; ComponentLink2URL: http://www.farnell.com/datasheets/2162814.pdf?src-supplier=Element14; ComponentLink2Description: http://www.farnell.com/datasheets/2162814.pdf?src-supplier=Element14; ComponentLink3URL: https://datasheets.maximintegrated.com/en/ds/MAX30102.pdf?src-supplier=Digi-Key; ComponentLink3Description: Datasheet; Supplier Part Number 1: MAX30102EFD+-ND
footprint PSON80P330X560X165-14N
pins: 2 SCL (in), 3 SDA (io), 4 PGND (power), 5 R_DRV (out), 6 IR_DRV (out), 9 VLED+ (power), 10 VLED+ (power), 11 VDD (power), 12 GND (power), 13 ~{INT} (out)